# Altium integrated library Optic-LED.IntLib: 2 symbols
Pins are listed as number, name and electrical type; pins without a type are passive.

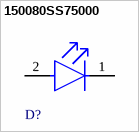
[diagram p0: symbol 150080SS75000]

## 150080SS75000
designator D?  (value not drawn)
footprint Type 3mm Green (THT, LED-3mm, 2pin- Body 4.15mm(max))
footprint Type 3mm Blue (THT, LED-3mm, 2pin- Body 4.15mm(max))
footprint Type 3mm Yellow (THT, LED-3mm, 2pin- Body 4.15mm(max))
footprint Type 3mm_RED (THT, LED-3mm, 2pin- Body 4.15mm(max))
footprint Type 3mm White (THT, LED-3mm, 2pin- Body 4.15mm(max))
pins: 1 C, 2 A


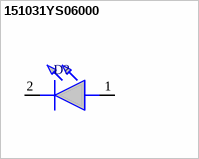
[diagram p1: symbol 151031YS06000]

## 151031YS06000
designator D?
WURTH ELEKTRONIK - 151031YS06000 - LED, Yellow, Through Hole, T-1 (3mm), 30 mA, 2 V, 590 nm; Geometry.Height: 5.5mm; Manufacturer_Name: Wurth Elektronik; Manufacturer_Part_Number: 151031YS06000; Mouser Part Number: 710-151031YS06000; Mouser Price/Stock: https://www.mouser.co.uk/ProductDetail/Wurth-Elektronik/151031YS06000?qs=LlUlMxKIyB3xSYYW%252BcuBiQ%3D%3D; Arrow Part Number: *; Arrow Price/Stock: *; Mouser Testing Part Number: *; Mouser Testing Price/Stock: *; Datasheet Link: https://katalog.we-online.de/led/datasheet/151031YS06000.pdf
footprint LED_BLUE
footprint LED_GREEN
footprint LED_Yellow
footprint Wurth_Electronics_0_MFG
pins: 1 A, 2 K